# Altium footprint library kalios.PcbLib: 404 footprints (part 11 of 26)
Each footprint in its own frame and in the unit in brackets; x right, y up, seen from the top. Pads: shape width x height; smd on the part's side, far side on the other; paste and mask are expansions set on the pad; w line width, h text height; cw(c..) or ccw(c..) is an arc to the next point about the centre after c.
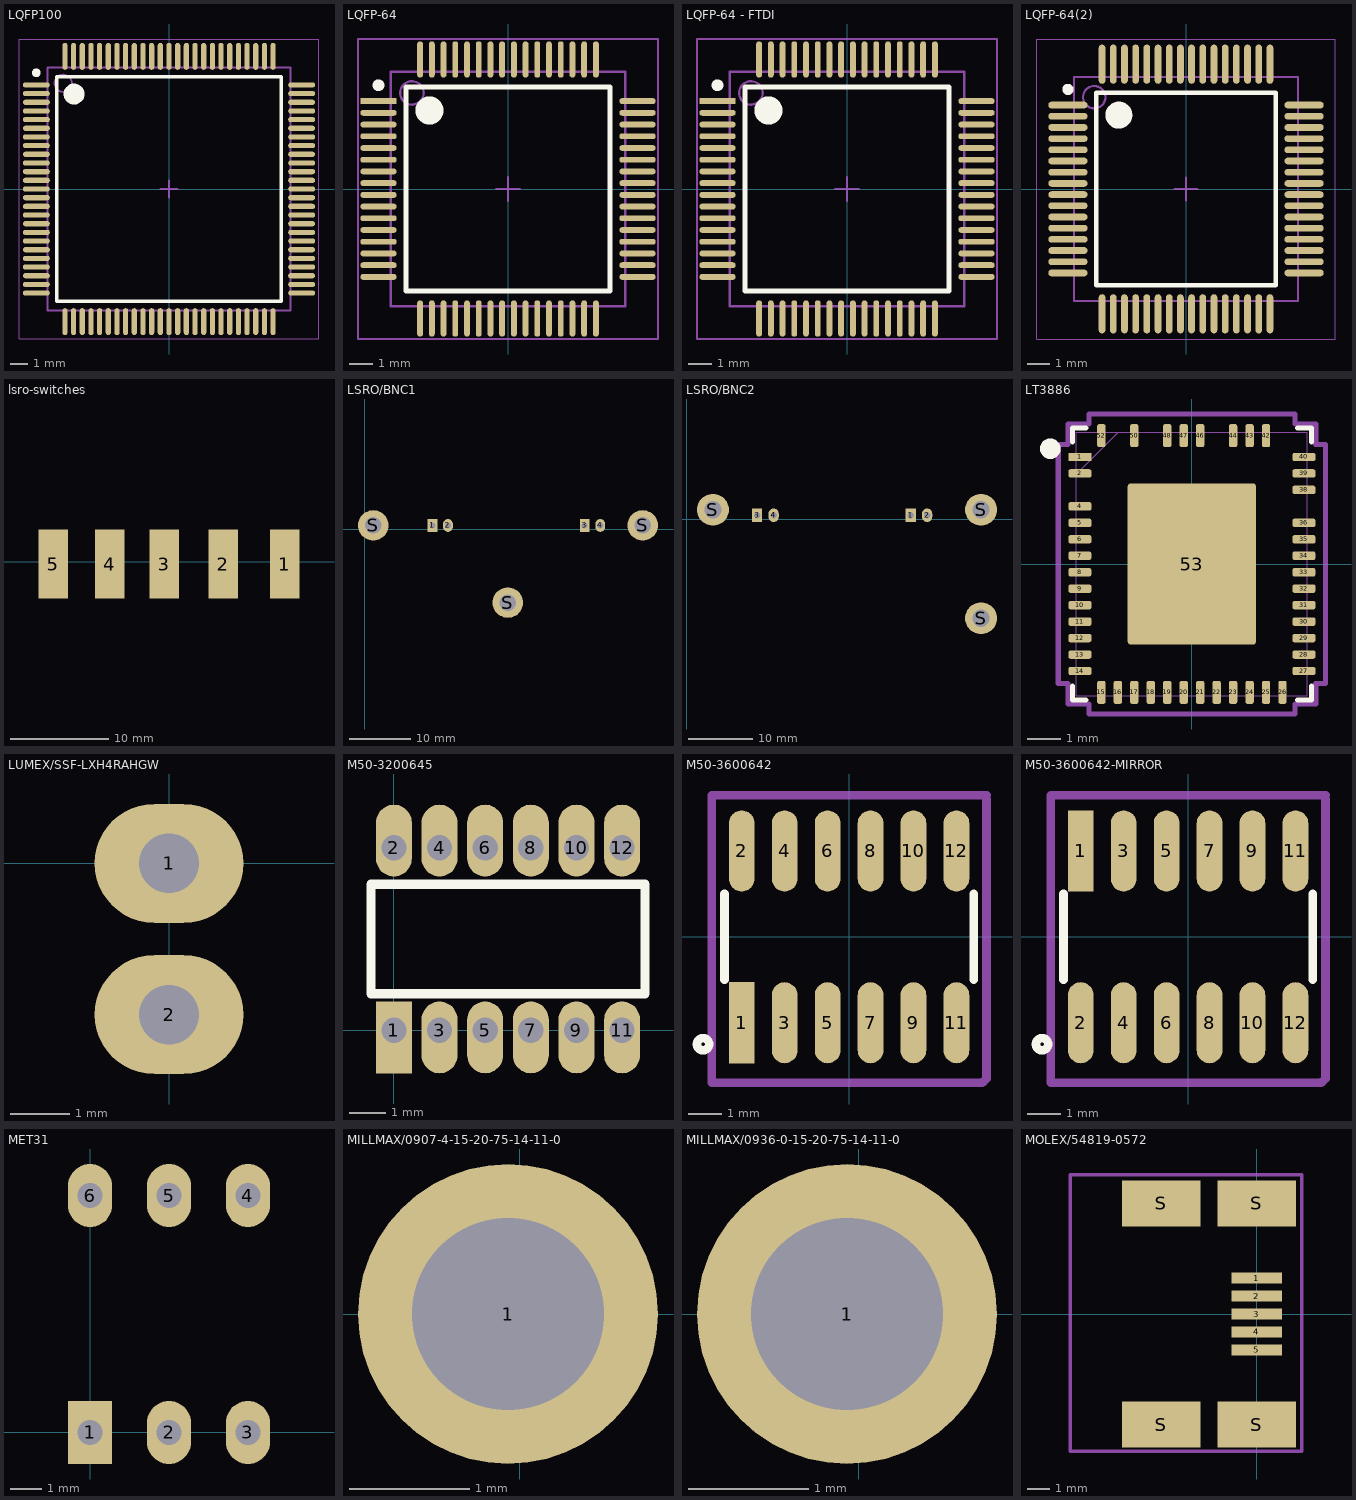
[diagram p10: the footprints below, top view; thin cyan lines are the x and y axes]

## LQFP100 [mm]
height 1.6
pads (100):
  oval 1.55x0.3 smd: 1(-7.65,6) 2(-7.65,5.5) 3(-7.65,5) 4(-7.65,4.5) 5(-7.65,4) 6(-7.65,3.5) 7(-7.65,3) 8(-7.65,2.5) 9(-7.65,2) 10(-7.65,1.5) 11(-7.65,1) 12(-7.65,0.5) 13(-7.65,0) 14(-7.65,-0.5) 15(-7.65,-1) 16(-7.65,-1.5) 17(-7.65,-2) 18(-7.65,-2.5) 19(-7.65,-3) 20(-7.65,-3.5) 21(-7.65,-4) 22(-7.65,-4.5) 23(-7.65,-5) 24(-7.65,-5.5) 25(-7.65,-6) 51(7.65,-6) 52(7.65,-5.5) 53(7.65,-5) 54(7.65,-4.5) 55(7.65,-4) 56(7.65,-3.5) 57(7.65,-3) 58(7.65,-2.5) 59(7.65,-2) 60(7.65,-1.5) 61(7.65,-1) 62(7.65,-0.5) 63(7.65,0) 64(7.65,0.5) 65(7.65,1) 66(7.65,1.5) 67(7.65,2) 68(7.65,2.5) 69(7.65,3) 70(7.65,3.5) 71(7.65,4) 72(7.65,4.5) 73(7.65,5) 74(7.65,5.5) 75(7.65,6)
  oval 0.3x1.55 smd: 26(-6,-7.65) 27(-5.5,-7.65) 28(-5,-7.65) 29(-4.5,-7.65) 30(-4,-7.65) 31(-3.5,-7.65) 32(-3,-7.65) 33(-2.5,-7.65) 34(-2,-7.65) 35(-1.5,-7.65) 36(-1,-7.65) 37(-0.5,-7.65) 38(0,-7.65) 39(0.5,-7.65) 40(1,-7.65) 41(1.5,-7.65) 42(2,-7.65) 43(2.5,-7.65) 44(3,-7.65) 45(3.5,-7.65) 46(4,-7.65) 47(4.5,-7.65) 48(5,-7.65) 49(5.5,-7.65) 50(6,-7.65) 76(6,7.65) 77(5.5,7.65) 78(5,7.65) 79(4.5,7.65) 80(4,7.65) 81(3.5,7.65) 82(3,7.65) 83(2.5,7.65) 84(2,7.65) 85(1.5,7.65) 86(1,7.65) 87(0.5,7.65) 88(0,7.65) 89(-0.5,7.65) 90(-1,7.65) 91(-1.5,7.65) 92(-2,7.65) 93(-2.5,7.65) 94(-3,7.65) 95(-3.5,7.65) 96(-4,7.65) 97(-4.5,7.65) 98(-5,7.65) 99(-5.5,7.65) 100(-6,7.65)
Top Overlay:
  circle w0.6: c-5.475,5.475 r0.3
  circle w0.25: c-7.65,6.7 r0.125
  lines w0.2: -6.475,-6.475 6.475,-6.475 6.475,6.475 -6.475,6.475 -6.475,-6.475
Top 3D Body:
  circle w0.1: c-6.1,6.1 r0.5
  lines w0.1: -7,-7 7,-7 7,7 -7,7 -7,-7
Top Courtyard:
  lines w0.05: -8.65,-8.65 8.65,-8.65 8.65,8.65 -8.65,8.65 -8.65,-8.65
  lines w0.1: -0.5,0 0.5,0 ; 0,-0.5 0,0.5
Top Designator:
  text ".Designator" at -7.618,-0.508 h1.52
3D body "LQFP100.STEP": height 1.6, standoff 0, extent -8,-8 8,8

## LQFP-64 [mm] "64-Pin Thin Quad Flat Pack 0.5 mm Pitch, IPC High Density"
height 1.6
pads (64):
  rect 1.55x0.25 smd: 1(-5.525,3.75)
  oval 1.55x0.25 smd: 2(-5.525,3.25) 3(-5.525,2.75) 4(-5.525,2.25) 5(-5.525,1.75) 6(-5.525,1.25) 7(-5.525,0.75) 8(-5.525,0.25) 9(-5.525,-0.25) 10(-5.525,-0.75) 11(-5.525,-1.25) 12(-5.525,-1.75) 13(-5.525,-2.25) 14(-5.525,-2.75) 15(-5.525,-3.25) 16(-5.525,-3.75) 33(5.525,-3.75) 34(5.525,-3.25) 35(5.525,-2.75) 36(5.525,-2.25) 37(5.525,-1.75) 38(5.525,-1.25) 39(5.525,-0.75) 40(5.525,-0.25) 41(5.525,0.25) 42(5.525,0.75) 43(5.525,1.25) 44(5.525,1.75) 45(5.525,2.25) 46(5.525,2.75) 47(5.525,3.25) 48(5.525,3.75)
  oval 0.25x1.55 smd: 17(-3.75,-5.525) 18(-3.25,-5.525) 19(-2.75,-5.525) 20(-2.25,-5.525) 21(-1.75,-5.525) 22(-1.25,-5.525) 23(-0.75,-5.525) 24(-0.25,-5.525) 25(0.25,-5.525) 26(0.75,-5.525) 27(1.25,-5.525) 28(1.75,-5.525) 29(2.25,-5.525) 30(2.75,-5.525) 31(3.25,-5.525) 32(3.75,-5.525) 49(3.75,5.525) 50(3.25,5.525) 51(2.75,5.525) 52(2.25,5.525) 53(1.75,5.525) 54(1.25,5.525) 55(0.75,5.525) 56(0.25,5.525) 57(-0.25,5.525) 58(-0.75,5.525) 59(-1.25,5.525) 60(-1.75,5.525) 61(-2.25,5.525) 62(-2.75,5.525) 63(-3.25,5.525) 64(-3.75,5.525)
Top Overlay:
  circle w0.6: c-3.35,3.35 r0.3
  circle w0.25: c-5.525,4.425 r0.125
  lines w0.2: -4.35,-4.35 4.35,-4.35 4.35,4.35 -4.35,4.35 -4.35,-4.35
Top 3D Body:
  circle w0.1: c-4.1,4.1 r0.5
  lines w0.1: -5,-5 5,-5 5,5 -5,5 -5,-5
Top Courtyard:
  lines w0.1: -0.5,0 0.5,0 ; 0,-0.5 0,0.5 ; -6.4,-6.4 6.4,-6.4 6.4,6.4 -6.4,6.4 -6.4,-6.4
Top Designator:
  text ".Designator" at -7.618,-0.508 h1.52
3D body "LQFP-64.STEP": height 1.7, standoff -0.01, extent -6,-6.006 6,5.994

## LQFP-64 - FTDI [mm] "64-Pin Thin Quad Flat Pack 0.5 mm Pitch, IPC High Density"
height 1.6
pads (64):
  rect 1.55x0.25 smd: 1(-5.525,3.75)
  oval 1.55x0.25 smd: 2(-5.525,3.25) 3(-5.525,2.75) 4(-5.525,2.25) 5(-5.525,1.75) 6(-5.525,1.25) 7(-5.525,0.75) 8(-5.525,0.25) 9(-5.525,-0.25) 10(-5.525,-0.75) 11(-5.525,-1.25) 12(-5.525,-1.75) 13(-5.525,-2.25) 14(-5.525,-2.75) 15(-5.525,-3.25) 16(-5.525,-3.75) 33(5.525,-3.75) 34(5.525,-3.25) 35(5.525,-2.75) 36(5.525,-2.25) 37(5.525,-1.75) 38(5.525,-1.25) 39(5.525,-0.75) 40(5.525,-0.25) 41(5.525,0.25) 42(5.525,0.75) 43(5.525,1.25) 44(5.525,1.75) 45(5.525,2.25) 46(5.525,2.75) 47(5.525,3.25) 48(5.525,3.75)
  oval 0.25x1.55 smd: 17(-3.75,-5.525) 18(-3.25,-5.525) 19(-2.75,-5.525) 20(-2.25,-5.525) 21(-1.75,-5.525) 22(-1.25,-5.525) 23(-0.75,-5.525) 24(-0.25,-5.525) 25(0.25,-5.525) 26(0.75,-5.525) 27(1.25,-5.525) 28(1.75,-5.525) 29(2.25,-5.525) 30(2.75,-5.525) 31(3.25,-5.525) 32(3.75,-5.525) 49(3.75,5.525) 50(3.25,5.525) 51(2.75,5.525) 52(2.25,5.525) 53(1.75,5.525) 54(1.25,5.525) 55(0.75,5.525) 56(0.25,5.525) 57(-0.25,5.525) 58(-0.75,5.525) 59(-1.25,5.525) 60(-1.75,5.525) 61(-2.25,5.525) 62(-2.75,5.525) 63(-3.25,5.525) 64(-3.75,5.525)
Top Overlay:
  circle w0.6: c-3.35,3.35 r0.3
  circle w0.25: c-5.525,4.425 r0.125
  lines w0.2: -4.35,-4.35 4.35,-4.35 4.35,4.35 -4.35,4.35 -4.35,-4.35
Top 3D Body:
  circle w0.1: c-4.1,4.1 r0.5
  lines w0.1: -5,-5 5,-5 5,5 -5,5 -5,-5
Top Courtyard:
  lines w0.1: -0.5,0 0.5,0 ; 0,-0.5 0,0.5 ; -6.4,-6.4 6.4,-6.4 6.4,6.4 -6.4,6.4 -6.4,-6.4
Top Designator:
  text ".Designator" at -7.618,-0.508 h1.52
3D body "lqfp64 - ftdi.STEP": height 1.5, standoff 0.02, extent -5.994,-6.006 6.006,5.994

## LQFP-64(2) [mm] "TSQFP, 64-Leads, Body 10.00x10.00mm, Pitch 0.50mm, IPC Medium Density"
height 1.6
pads (64):
  oval 1.75x0.3 smd: 1(-5.275,3.75) 2(-5.275,3.25) 3(-5.275,2.75) 4(-5.275,2.25) 5(-5.275,1.75) 6(-5.275,1.25) 7(-5.275,0.75) 8(-5.275,0.25) 9(-5.275,-0.25) 10(-5.275,-0.75) 11(-5.275,-1.25) 12(-5.275,-1.75) 13(-5.275,-2.25) 14(-5.275,-2.75) 15(-5.275,-3.25) 16(-5.275,-3.75) 33(5.275,-3.75) 34(5.275,-3.25) 35(5.275,-2.75) 36(5.275,-2.25) 37(5.275,-1.75) 38(5.275,-1.25) 39(5.275,-0.75) 40(5.275,-0.25) 41(5.275,0.25) 42(5.275,0.75) 43(5.275,1.25) 44(5.275,1.75) 45(5.275,2.25) 46(5.275,2.75) 47(5.275,3.25) 48(5.275,3.75)
  oval 0.3x1.75 smd: 17(-3.75,-5.575) 18(-3.25,-5.575) 19(-2.75,-5.575) 20(-2.25,-5.575) 21(-1.75,-5.575) 22(-1.25,-5.575) 23(-0.75,-5.575) 24(-0.25,-5.575) 25(0.25,-5.575) 26(0.75,-5.575) 27(1.25,-5.575) 28(1.75,-5.575) 29(2.25,-5.575) 30(2.75,-5.575) 31(3.25,-5.575) 32(3.75,-5.575) 49(3.75,5.575) 50(3.25,5.575) 51(2.75,5.575) 52(2.25,5.575) 53(1.75,5.575) 54(1.25,5.575) 55(0.75,5.575) 56(0.25,5.575) 57(-0.25,5.575) 58(-0.75,5.575) 59(-1.25,5.575) 60(-1.75,5.575) 61(-2.25,5.575) 62(-2.75,5.575) 63(-3.25,5.575) 64(-3.75,5.575)
Top Overlay:
  circle w0.25: c-5.275,4.45 r0.125
  circle w0.6: c-3,3.3 r0.3
  lines w0.2: -4,-4.3 -4,4.3 4,4.3 4,-4.3 -4,-4.3
Top 3D Body:
  circle w0.1: c-4.1,4.1 r0.5
  lines w0.1: -5,-5 -5,5 5,5 5,-5 -5,-5
Top Courtyard:
  lines w0.05: -6.675,-6.7 -6.675,6.7 6.675,6.7 6.675,-6.7 -6.675,-6.7
  lines w0.1: -0.5,0 0.5,0 ; 0,-0.5 0,0.5
Top Designator:
  text ".Designator" at -7.618,-0.508 h1.52
3D body: height 1.6, standoff 0.15, extent -5,-5 5,5

## lsro-switches [mm]
pads (5):
  rect 3x7 smd: 1(43.75,-0.25) 2(37.5,-0.25) 3(31.5,-0.25) 4(26,-0.25) 5(20.25,-0.25)
Top Designator:
  text ".Designator" at 35.794,-2.35 h1.52
3D body "PCB2.STEP": height 33.01, standoff -0.01, extent 16.5,-7.036 70.323,0.25

## LSRO/BNC1 [mm]
pads (7):
  rect 1.6x2.1 hole 1 unplated: 1(11.024,0.66) 3(35.89,0.66)
  oval 1.6x2.1 hole 1 unplated: 2(13.564,0.66) 4(38.43,0.66)
  round 5 hole 2.7 unplated: S(1.37,0.66) S(23.343,-11.938) S(45.364,0.66)
Top Designator:
  text ".Designator" at 15.751,-17.759 h1.52
3D body "BNC1.STEP": height 30.6, standoff -2.54, extent -1.632,-38.161 48.368,3.658

## LSRO/BNC2 [mm]
pads (7):
  rect 1.6x2.1 hole 1 unplated: 1(35.077,0.66) 3(11.024,0.66)
  oval 1.6x2.1 hole 1 unplated: 2(37.643,0.66) 4(13.614,0.66)
  round 5 hole 2.7 unplated: S(4.115,1.524) S(46.076,-15.469) S(46.076,1.524)
Top Designator:
  text ".Designator" at 17.478,-18.669 h1.52
3D body "BNC2.STEP": height 30.6, standoff -2.54, extent 0.095,-41.936 50.095,5.613

## LT3886 [mm]
pads (47):
  rect 0.7x0.255 smd paste+0 mask+0: 1(-3.401,3.25)
  rrect50% 0.7x0.255 smd paste+0 mask+0: 2(-3.401,2.75) 4(-3.401,1.75) 5(-3.401,1.25) 6(-3.401,0.75) 7(-3.401,0.25) 8(-3.401,-0.25) 9(-3.401,-0.75) 10(-3.401,-1.25) 11(-3.401,-1.75) 12(-3.401,-2.25) 13(-3.401,-2.75) 14(-3.401,-3.25) 27(3.401,-3.25) 28(3.401,-2.75) 29(3.401,-2.25) 30(3.401,-1.75) 31(3.401,-1.25) 32(3.401,-0.75) 33(3.401,-0.25) 34(3.401,0.25) 35(3.401,0.75) 36(3.401,1.25) 38(3.401,2.25) 39(3.401,2.75) 40(3.401,3.25)
  rrect50% 0.255x0.7 smd paste+0 mask+0: 15(-2.75,-3.896) 16(-2.25,-3.896) 17(-1.75,-3.896) 18(-1.25,-3.896) 19(-0.75,-3.896) 20(-0.25,-3.896) 21(0.25,-3.896) 22(0.75,-3.896) 23(1.25,-3.896) 24(1.75,-3.896) 25(2.25,-3.896) 26(2.75,-3.896) 42(2.25,3.896) 43(1.75,3.896) 44(1.25,3.896) 46(0.25,3.896) 47(-0.25,3.896) 48(-0.75,3.896) 50(-1.75,3.896) 52(-2.75,3.896)
  rrect5% 3.9x4.9 smd paste-2.832 mask+0: 53(0,0)
Top Overlay:
  circle w0.381: c-4.3,3.5 r0.12
  lines w0.152: -3.632,-3.71 -3.632,-4.127 -3.21,-4.127 ; -3.632,3.71 -3.632,4.127 -3.21,4.127 ; 3.21,-4.127 3.632,-4.127 3.632,-3.71 ; 3.21,4.127 3.632,4.127 3.632,3.71
Top Paste:
  region: 1.783,-1.1 0.417,-1.1 0.417,-2.322 1.783,-2.322
  region: 1.8,0.611 0.434,0.611 0.434,-0.611 1.8,-0.611
  region: 1.8,2.311 0.434,2.311 0.434,1.089 1.8,1.089
  region: -0.4,-1.089 -1.766,-1.089 -1.766,-2.311 -0.4,-2.311
  region: -0.417,0.622 -1.783,0.622 -1.783,-0.6 -0.417,-0.6
  region: -0.417,2.322 -1.783,2.322 -1.783,1.1 -0.417,1.1
Top 3D Body:
  lines w0.025: -3.505,2.73 -2.235,4 ; -3.505,-4 -3.505,4 3.505,4 3.505,-4 -3.505,-4 ; -3.505,-3.402 -3.505,-3.098 -3.505,-3.402 ; -3.505,-2.902 -3.505,-2.598 -3.505,-2.902 ; -3.505,-2.402 -3.505,-2.098 -3.505,-2.402 ; -3.505,-1.902 -3.505,-1.598 -3.505,-1.902 ; -3.505,-1.402 -3.505,-1.098 -3.505,-1.402 ; -3.505,-0.902 -3.505,-0.598 -3.505,-0.902 ; -3.505,-0.402 -3.505,-0.098 -3.505,-0.402 ; -3.505,0.098 -3.505,0.402 -3.505,0.098 ; -3.505,0.598 -3.505,0.902 -3.505,0.598 ; -3.505,1.098 -3.505,1.402 -3.505,1.098 ; -3.505,1.598 -3.505,1.902 -3.505,1.598 ; -3.505,2.098 -3.505,2.402 -3.505,2.098 ; -3.505,2.598 -3.505,2.902 -3.505,2.598 ; -3.505,3.098 -3.505,3.402 -3.505,3.098 ; -2.902,-4 -2.598,-4 -2.902,-4 ; -2.902,4 -2.598,4 -2.902,4 ; -2.402,-4 -2.098,-4 -2.402,-4 ; -2.402,4 -2.098,4 -2.402,4 ; -1.902,-4 -1.598,-4 -1.902,-4 ; -1.902,4 -1.598,4 -1.902,4 ; -1.402,-4 -1.098,-4 -1.402,-4 ; -1.402,4 -1.098,4 -1.402,4 ; -0.902,-4 -0.598,-4 -0.902,-4 ; -0.902,4 -0.598,4 -0.902,4 ; -0.402,-4 -0.098,-4 -0.402,-4 ; -0.402,4 -0.098,4 -0.402,4 ; 0.098,-4 0.402,-4 0.098,-4 ; 0.098,4 0.402,4 0.098,4 ; 0.598,-4 0.902,-4 0.598,-4 ; 0.598,4 0.902,4 0.598,4 ; 1.098,-4 1.402,-4 1.098,-4 ; 1.098,4 1.402,4 1.098,4 ; 1.598,-4 1.902,-4 1.598,-4 ; 1.598,4 1.902,4 1.598,4 ; 2.098,-4 2.402,-4 2.098,-4 ; 2.098,4 2.402,4 2.098,4 ; 2.598,-4 2.902,-4 2.598,-4 ; 2.598,4 2.902,4 2.598,4 ; 3.505,-3.402 3.505,-3.098 3.505,-3.402 ; 3.505,-2.902 3.505,-2.598 3.505,-2.902 ; 3.505,-2.402 3.505,-2.098 3.505,-2.402 ; 3.505,-1.902 3.505,-1.598 3.505,-1.902 ; 3.505,-1.402 3.505,-1.098 3.505,-1.402 ; 3.505,-0.902 3.505,-0.598 3.505,-0.902 ; 3.505,-0.402 3.505,-0.098 3.505,-0.402 ; 3.505,0.098 3.505,0.402 3.505,0.098 ; 3.505,0.598 3.505,0.902 3.505,0.598 ; 3.505,1.098 3.505,1.402 3.505,1.098 ; 3.505,1.598 3.505,1.902 3.505,1.598 ; 3.505,2.098 3.505,2.402 3.505,2.098 ; 3.505,2.598 3.505,2.902 3.505,2.598 ; 3.505,3.098 3.505,3.402 3.505,3.098
Top Courtyard:
  lines w0.152: -4.059,-3.631 -4.059,3.631 -3.759,3.631 -3.759,4.255 -3.131,4.255 -3.131,4.554 3.131,4.554 3.131,4.255 3.759,4.255 3.759,3.631 4.059,3.631 4.059,-3.631 3.759,-3.631 3.759,-4.255 3.131,-4.255 3.131,-4.554 -3.131,-4.554 -3.131,-4.255 -3.759,-4.255 -3.759,-3.631 -4.059,-3.631
Top Designator:
  text ".Designator" at -4.029,-0.233 h0.7
3D body "LTC3886.STEP": height 0.75, standoff -0.05, extent -3.55,-4.05 3.55,4.05

## LUMEX/SSF-LXH4RAHGW [mm]
pads (2):
  oval 2.5x2 hole 1: 1(0,0) 2(0,-2.54)
Top Designator:
  text ".Designator" at -13.175,-1.778 h1.52
3D body "SSF-LXH4RAHGW.STEP": height 7.68, standoff -3.14, extent -12.467,-3.51 0.403,0.99

## M50-3200645 [mm]
pads (12):
  rect 1x2 hole 0.7 copper offset 0,-0.2: 1(0,0)
  oval 1x2 hole 0.7 copper offset 0,0.2: 2(0,5.08) 4(1.27,5.08) 6(2.54,5.08) 8(3.81,5.08) 10(5.08,5.08) 12(6.35,5.08)
  oval 1x2 hole 0.7 copper offset 0,-0.2: 3(1.27,0) 5(2.54,0) 7(3.81,0) 9(5.08,0) 11(6.35,0)
Top Overlay:
  lines w0.254: -0.635,1.016 6.985,1.016 6.985,4.064 -0.635,4.064 -0.635,1.016
Top Designator:
  text ".Designator" at -4.443,2.032 h1.52
3D body "952-1378-5-ND.STEP": height 3.43, standoff -2.42, extent -0.635,0.026 6.985,5.156

## M50-3600642 [mm]
pads (12):
  rect 0.76x2.4 smd: 1(-3.175,-2.54)
  oval 0.76x2.4 smd: 2(-3.175,2.54) 3(-1.905,-2.54) 4(-1.905,2.54) 5(-0.635,-2.54) 6(-0.635,2.54) 7(0.635,-2.54) 8(0.635,2.54) 9(1.905,-2.54) 10(1.905,2.54) 11(3.175,-2.54) 12(3.175,2.54)
Top Overlay:
  circle w0.254: c-4.318,-3.175 r0.18
  lines w0.254: -3.683,-1.27 -3.683,1.27 ; 3.683,-1.27 3.683,1.27
Top Courtyard:
  lines w0.254: 4.064,4.064 4.064,-4.191 3.937,-4.318 -4.064,-4.318 -4.064,4.191 4.064,4.191
Top Designator:
  text ".Designator" at -7.834,-0.571 h1.52
3D body "952-1390-ND.STEP": height 4.7, standoff 0.02, extent -3.835,-2.731 3.785,2.769

## M50-3600642-MIRROR [mm]
pads (12):
  rect 0.76x2.4 smd: 1(-3.175,2.54)
  oval 0.76x2.4 smd: 2(-3.175,-2.54) 3(-1.905,2.54) 4(-1.905,-2.54) 5(-0.635,2.54) 6(-0.635,-2.54) 7(0.635,2.54) 8(0.635,-2.54) 9(1.905,2.54) 10(1.905,-2.54) 11(3.175,2.54) 12(3.175,-2.54)
Top Overlay:
  circle w0.254: c-4.318,-3.175 r0.18
  lines w0.254: -3.683,-1.27 -3.683,1.27 ; 3.683,-1.27 3.683,1.27
Top Courtyard:
  lines w0.254: 4.064,4.064 4.064,-4.191 3.937,-4.318 -4.064,-4.318 -4.064,4.191 4.064,4.191
Top Designator:
  text ".Designator" at -7.834,-0.571 h1.52
3D body "952-1390-ND.STEP": height 4.7, standoff 0.02, extent -3.835,-2.731 3.785,2.769

## MET31 [mm]
pads (6):
  rect 1.4x2 hole 0.8: 1(0,0)
  oval 1.4x2 hole 0.8: 2(2.5,0) 3(5,0) 4(5,7.5) 5(2.5,7.5) 6(0,7.5)
Top Designator:
  text ".Designator" at -5.128,3.295 h1.52
3D body "MET-31 .STEP": height 11.8, standoff -2.5, extent -1.446,-1.397 6.424,9.003

## MILLMAX/0907-4-15-20-75-14-11-0 [mm]
pads (1):
  round 2.5 hole 1.6: 1(-0.1,0)
Top Designator:
  text ".Designator" at -7.718,-0.508 h1.52
3D body "mill-max-0907-4-15-20-75-14-11-0.STEP": height 0.4, standoff -8.11, extent -1.014,-0.914 0.814,0.914

## MILLMAX/0936-0-15-20-75-14-11-0 [mm]
pads (1):
  round 2.5 hole 1.6: 1(-0.1,0)
Top Designator:
  text ".Designator" at -7.718,-0.508 h1.52
3D body "mill-max-0936-0-15-20-75-14-11-0.STEP": height 0.4, standoff -5.11, extent -1.014,-0.914 0.814,0.914

## MOLEX/54819-0572 [mm] "CONN RECEPT MINIUSB R/A 5POS SMD"
pads (9):
  rect 2.25x0.5 smd: 1(0,1.6) 2(0,0.8) 3(0,0) 4(0,-0.8) 5(0,-1.6)
  rect 3.5x2.05 smd: S(-4.25,-4.925) S(-4.25,4.925) S(0,-4.925) S(0,4.925)
Top Courtyard:
  lines w0.15: -8.3,-6.1 2,-6.1 2,6.2 -8.3,6.2 -8.3,-6.1
Top Designator:
  text ".Designator" at -10.768,-0.458 h1.52
3D body "548190572.STEP": height 3.95, standoff 0, extent -8.3,-4.95 0.7,4.95